# Altium footprint library LUCHADOR PCBLIB.PcbLib: 75 footprints (part 1 of 5)
Each footprint in its own frame and in the unit in brackets; x right, y up, seen from the top. Pads: shape width x height; smd on the part's side, far side on the other; paste and mask are expansions set on the pad; w line width, h text height; cw(c..) or ccw(c..) is an arc to the next point about the centre after c.
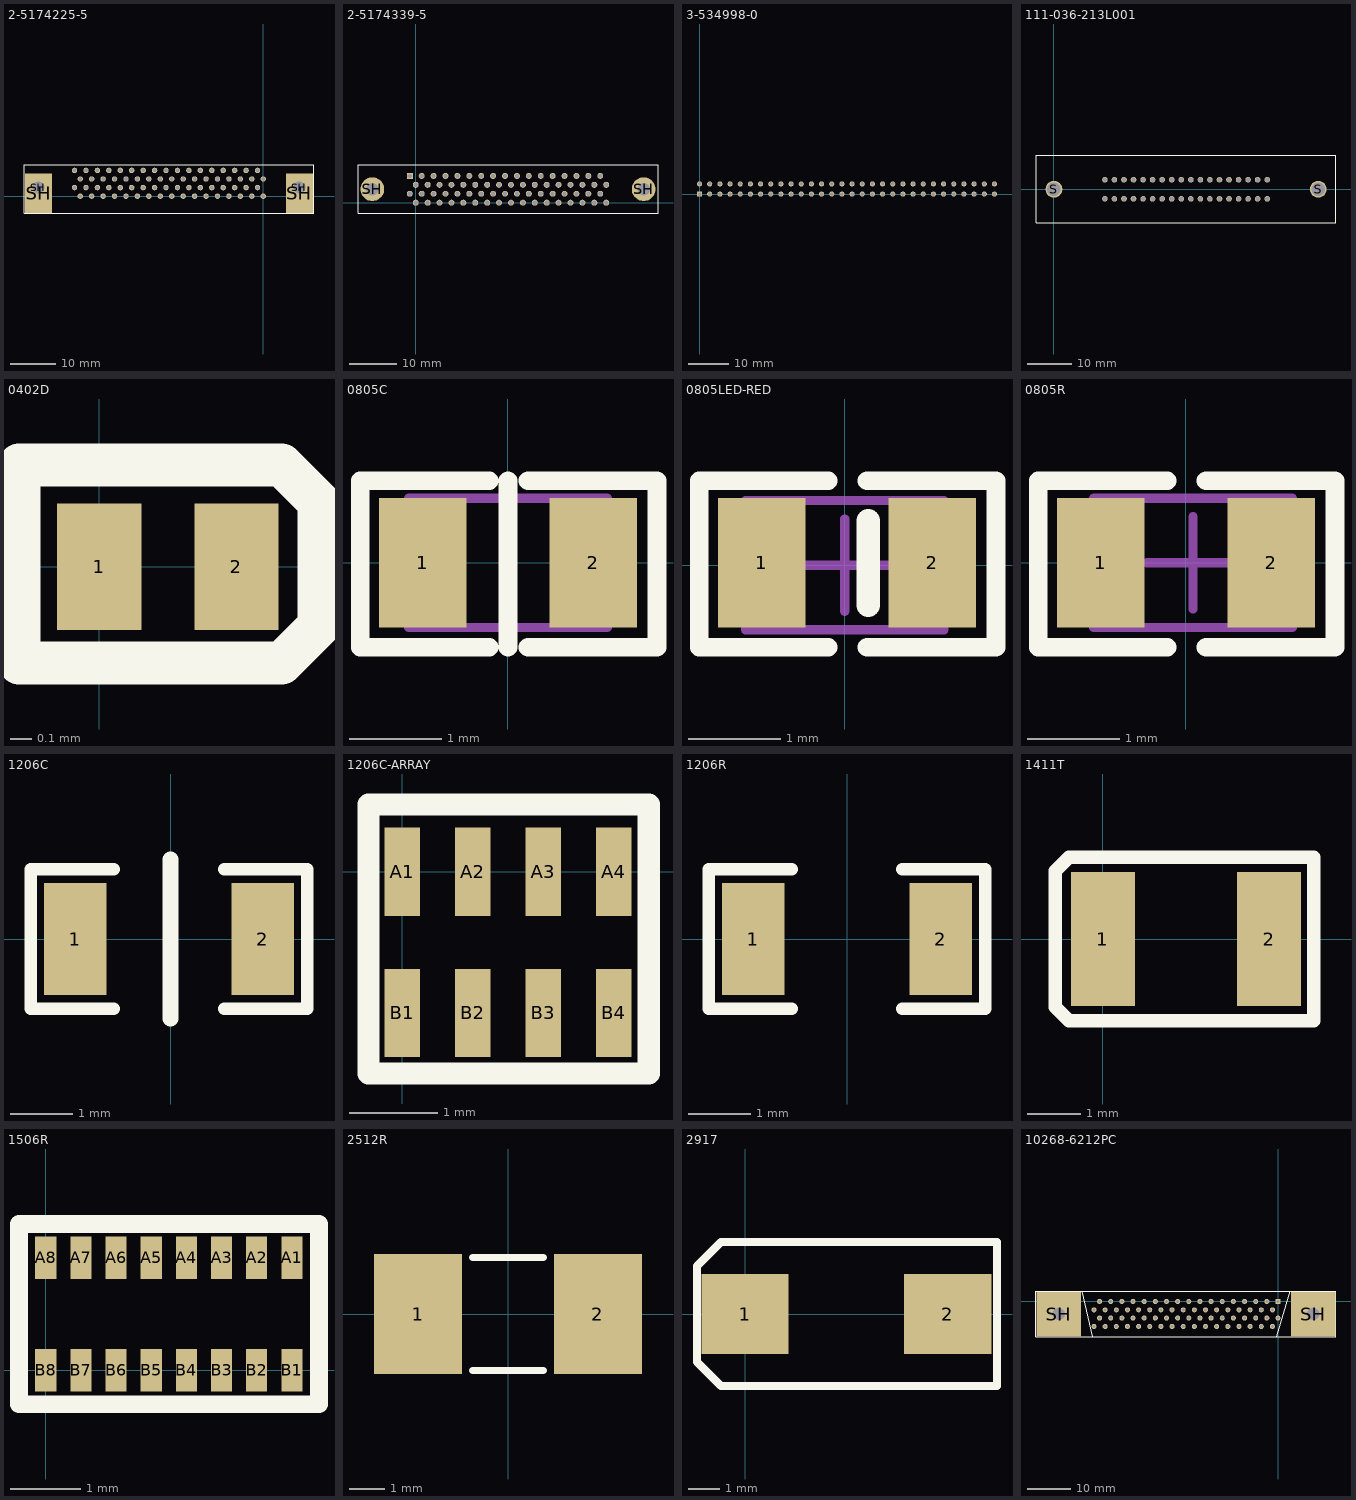
[diagram p0: the footprints below, top view; thin cyan lines are the x and y axes]

## 2-5174225-5 [mm]
pads (72):
  round 1.2 hole 0.8: 1(-41.91,5.715) 2(-40.64,3.81) 3(-39.37,5.715) 4(-38.1,3.81) 5(-36.83,5.715) 6(-35.56,3.81) 7(-34.29,5.715) 8(-33.02,3.81) 9(-31.75,5.715) 10(-30.48,3.81) 11(-29.21,5.715) 12(-27.94,3.81) 13(-26.67,5.715) 14(-25.4,3.81) 15(-24.13,5.715) 16(-22.86,3.81) 17(-21.59,5.715) 18(-20.32,3.81) 19(-19.05,5.715) 20(-17.78,3.81) 21(-16.51,5.715) 22(-15.24,3.81) 23(-13.97,5.715) 24(-12.7,3.81) 25(-11.43,5.715) 26(-10.16,3.81) 27(-8.89,5.715) 28(-7.62,3.81) 29(-6.35,5.715) 30(-5.08,3.81) 31(-3.81,5.715) 32(-2.54,3.81) 33(-1.27,5.715) 34(0,3.81) 35(-41.91,1.905) 36(-40.64,0) 37(-39.37,1.905) 38(-38.1,0) 39(-36.83,1.905) 40(-35.56,0) 41(-34.29,1.905) 42(-33.02,0) 43(-31.75,1.905) 44(-30.48,0) 45(-29.21,1.905) 46(-27.94,0) 47(-26.67,1.905) 48(-25.4,0) 49(-24.13,1.905) 50(-22.86,0) 51(-21.59,1.905) 52(-20.32,0) 53(-19.05,1.905) 54(-17.78,0) 55(-16.51,1.905) 56(-15.24,0) 57(-13.97,1.905) 58(-12.7,0) 59(-11.43,1.905) 60(-10.16,0) 61(-8.89,1.905) 62(-7.62,0) 63(-6.35,1.905) 64(-5.08,0) 65(-3.81,1.905) 66(-2.54,0) 67(-1.27,1.905) 68(0,0)
  round 3.7 hole 2.7: SH(-49.91,1.905) SH(8,1.905)
  rect 6x8.705 smd: SH(-49.886,0.66) SH(8.026,0.66)
Top Overlay:
  lines w0.254: -53.086,-3.81 11.176,-3.81 11.176,6.985 -53.086,6.985 -53.086,-3.81
3D body "c-2-5174225-5-a-3d.stp": height 9.51, standoff -2.89, extent -52.908,-10.515 11.002,6.985

## 2-5174339-5 [mil]
pads (70):
  rect 50x50 hole 35: 1(-50,225)
  round 50 hole 35: 2(0,150) 3(50,225) 4(100,150) 5(150,225) 6(200,150) 7(250,225) 8(300,150) 9(350,225) 10(400,150) 11(450,225) 12(500,150) 13(550,225) 14(600,150) 15(650,225) 16(700,150) 17(750,225) 18(800,150) 19(850,225) 20(900,150) 21(950,225) 22(1000,150) 23(1050,225) 24(1100,150) 25(1150,225) 26(1200,150) 27(1250,225) 28(1300,150) 29(1350,225) 30(1400,150) 31(1450,225) 32(1500,150) 33(1550,225) 34(1600,150) 35(-50,75) 36(0,0) 37(50,75) 38(100,0) 39(150,75) 40(200,0) 41(250,75) 42(300,0) 43(350,75) 44(400,0) 45(450,75) 46(500,0) 47(550,75) 48(600,0) 49(650,75) 50(700,0) 51(750,75) 52(800,0) 53(850,75) 54(900,0) 55(950,75) 56(1000,0) 57(1050,75) 58(1100,0) 59(1150,75) 60(1200,0) 61(1250,75) 62(1300,0) 63(1350,75) 64(1400,0) 65(1450,75) 66(1500,0) 67(1550,75) 68(1600,0)
  round 200 hole 106.3: SH(-365,113) SH(1915,113)
Top Overlay:
  lines w10: -485,-90 2035,-90 2035,320 -485,320 -485,-90
3D body "c-2-5174339-5-a-3d.stp": height 366.64, standoff -121.55, extent -483,-89.76 2033.14,315.76

## 3-534998-0 [mil]
pads (60):
  rect 50x50 hole 35: 1(0,0)
  round 50 hole 35: 2(0,100) 3(100,0) 4(100,100) 5(200,0) 6(200,100) 7(300,0) 8(300,100) 9(400,0) 10(400,100) 11(500,0) 12(500,100) 13(600,0) 14(600,100) 15(700,0) 16(700,100) 17(800,0) 18(800,100) 19(900,0) 20(900,100) 21(1000,0) 22(1000,100) 23(1100,0) 24(1100,100) 25(1200,0) 26(1200,100) 27(1300,0) 28(1300,100) 29(1400,0) 30(1400,100) 31(1500,0) 32(1500,100) 33(1600,0) 34(1600,100) 35(1700,0) 36(1700,100) 37(1800,0) 38(1800,100) 39(1900,0) 40(1900,100) 41(2000,0) 42(2000,100) 43(2100,0) 44(2100,100) 45(2200,0) 46(2200,100) 47(2300,0) 48(2300,100) 49(2400,0) 50(2400,100) 51(2500,0) 52(2500,100) 53(2600,0) 54(2600,100) 55(2700,0) 56(2700,100) 57(2800,0) 58(2800,100) 59(2900,0) 60(2900,100)

## 111-036-213L001 [mil]
pads (38):
  round 50 hole 39: 1(1898,85) 2(1813,85) 3(1728,85) 4(1643,85) 5(1558,85) 6(1473,85) 7(1388,85) 8(1303,85) 9(1218,85) 10(1133,85) 11(1048,85) 12(963,85) 13(878,85) 14(793,85) 15(708,85) 16(623,85) 17(538,85) 18(453,85) 19(1898,-85) 20(1813,-85) 21(1728,-85) 22(1643,-85) 23(1558,-85) 24(1473,-85) 25(1388,-85) 26(1303,-85) 27(1218,-85) 28(1133,-85) 29(1048,-85) 30(963,-85) 31(878,-85) 32(793,-85) 33(708,-85) 34(623,-85) 35(538,-85) 36(453,-84)
  round 150 hole 120: S(0,0) S(2352,0)
Top Overlay:
  lines w10: -160,-300 2510,-300 2510,305 -160,305 -160,-300
3D body "111-036-213L001.STEP": height 502.5, standoff -216.5, extent -157.5,-301 2509.5,301

## 0402D [mm]
pads (2):
  rect 0.4x0.6 smd: 1(0,0) 2(0.65,0)
Top Overlay:
  lines w0.203: -0.381,-0.457 0.864,-0.457 1.041,-0.279 1.041,0.305 0.864,0.483 -0.381,0.483 -0.381,-0.457
3D body "DPY.STEP": height 0.46, standoff 0.01, extent -0.17,-0.295 0.83,0.305

## 0805C [mm]
height 0.762
pads (2):
  rect 0.95x1.4 smd: 1(-0.925,0) 2(0.925,0)
Top Overlay:
  lines w0.203: -0.204,-0.914 -1.601,-0.914 -1.601,0.889 -0.204,0.889 ; 0,-0.914 0,0.889 ; 0.218,-0.914 1.615,-0.914 1.615,0.889 0.218,0.889
Mechanical 13:
  lines w0.1: -1.075,-0.7 1.075,-0.7 1.075,0.7 -1.075,0.7 -1.075,-0.7
3D body "SW3dPS-0805 SMD Capacitor.STEP": height 0.8, standoff 0.02, extent -1,-0.61 1,0.64

## 0805LED-RED [mm] "Chip Resistor, Body 2.0x1.3mm, IPC Low Density"
height 0.65
pads (2):
  rect 0.95x1.4 smd: 1(-0.9,0.025) 2(0.95,0.025)
Top Overlay:
  lines w0.203: -0.179,-0.889 -1.576,-0.889 -1.576,0.914 -0.179,0.914 ; 0.243,-0.889 1.64,-0.889 1.64,0.914 0.243,0.914
  lines w0.254: 0.254,-0.432 0.254,0.483
Mechanical 13:
  lines w0.1: -1.075,-0.7 1.075,-0.7 1.075,0.7 -1.075,0.7 -1.075,-0.7
Mechanical 15:
  lines w0.1: -0.5,0 0.5,0 ; 0,-0.5 0,0.5
3D body "User Library-led_0805.STEP": height 1.1, standoff 0, extent -1.035,-0.599 0.985,0.65

## 0805R [mm] "Chip Resistor, Body 2.0x1.3mm, IPC Low Density"
height 0.65
pads (2):
  rect 0.95x1.4 smd: 1(-0.925,0) 2(0.925,0)
Top Overlay:
  lines w0.203: -0.204,-0.914 -1.601,-0.914 -1.601,0.889 -0.204,0.889 ; 0.218,-0.914 1.615,-0.914 1.615,0.889 0.218,0.889
Mechanical 13:
  lines w0.1: -1,-0.7 1.15,-0.7 1.15,0.7 -1,0.7 -1,-0.7
Mechanical 15:
  lines w0.1: -0.425,0 0.575,0 ; 0.075,-0.5 0.075,0.5
3D body "SW3dPS-0805 SMD Resistor.STEP": height 0.8, standoff 0.02, extent -1.01,-0.625 0.99,0.625

## 1206C [mm]
pads (2):
  rect 1x1.8 smd: 1(-1.525,0) 2(1.475,0)
Top Overlay:
  lines w0.203: -0.914,-1.118 -2.235,-1.118 -2.235,1.118 -0.914,1.118 ; 0.864,-1.118 2.184,-1.118 2.184,1.118 0.864,1.118
  lines w0.254: 0,-1.27 0,1.27
3D body "MK316.STEP": height 1.62, standoff 0.02, extent -1.625,-0.838 1.575,0.762

## 1206C-ARRAY [mm]
pads (8):
  rect 0.4x1 smd: A1(0,0) A2(0.8,0) A3(1.6,0) A4(2.4,0) B1(0,-1.6) B2(0.8,-1.6) B3(1.6,-1.6) B4(2.4,-1.6)
Top Overlay:
  lines w0.254: -0.381,-2.286 2.794,-2.286 2.794,0.762 -0.381,0.762 -0.381,-2.286
3D body "User Library-ArrayCap1206.STEP": height 1.03, standoff 0.01, extent -0.33,-1.549 2.718,-0.025

## 1206R [mm]
pads (2):
  rect 1x1.8 smd: 1(-1.5,0) 2(1.5,0)
Top Overlay:
  lines w0.203: -0.889,-1.118 -2.21,-1.118 -2.21,1.118 -0.889,1.118 ; 0.889,-1.118 2.21,-1.118 2.21,1.118 0.889,1.118
3D body "SW3dPS-1206 SMD Resistor.STEP": height 1.02, standoff 0.02, extent -1.575,-0.787 1.625,0.813

## 1411T [mm]
pads (2):
  rect 1.2x2.5 smd: 1(0,0) 2(3.1,0)
Top Overlay:
  lines w0.254: -0.889,-1.27 -0.635,-1.524 3.937,-1.524 3.937,1.524 -0.635,1.524 -0.889,1.27 -0.889,-1.27
3D body "User Library-AVX_BCASE.STEP": height 2.03, standoff 0, extent -0.3,-1.465 3.4,1.465

## 1506R [mm]
pads (16):
  rect 0.3x0.6 smd: A1(3.5,1.6) A2(3,1.6) A3(2.5,1.6) A4(2,1.6) A5(1.5,1.6) A6(1,1.6) A7(0.5,1.6) A8(0,1.6) B1(3.5,0) B2(3,0) B3(2.5,0) B4(2,0) B5(1.5,0) B6(1,0) B7(0.5,0) B8(0,0)
Top Overlay:
  lines w0.254: -0.381,-0.483 3.886,-0.483 3.886,2.083 -0.381,2.083 -0.381,-0.483
3D body "RESISTOR ARRAY.STEP": height 0.46, standoff 0.01, extent -0.147,-0.013 3.653,1.587

## 2512R [mm] "Chip Resistor; Body 6.4 x 3.2 mm (LxW typ)"
height 1.2
pads (2):
  rect 2.5x3.4 smd: 1(-2.55,0) 2(2.55,0)
Top Overlay:
  lines w0.2: -1,-1.6 1,-1.6 ; -1,1.6 1,1.6
3D body "User Library-2512 SMD Resistor.STEP": height 1.62, standoff 0.02, extent -3.022,-1.424 3.328,1.576

## 2917 [mm]
pads (2):
  rect 2.77x2.55 smd: 1(0,0) 2(6.44,0)
Top Overlay:
  lines w0.254: -1.524,-1.524 -0.762,-2.286 8.001,-2.286 8.001,2.286 -0.508,2.286 -0.762,2.286 -1.524,1.524 -1.524,-1.524
3D body "User Library-AVX_E_CASE.STEP": height 4.21, standoff 0.01, extent -0.525,-2.225 6.876,2.225

## 10268-6212PC [mil]
pads (70):
  rect 45x45 hole 28: 1(0,0)
  round 45 hole 28: 2(-50,-75) 3(-100,0) 4(-150,-75) 5(-200,0) 6(-250,-75) 7(-300,0) 8(-350,-75) 9(-400,0) 10(-450,-75) 11(-500,0) 12(-550,-75) 13(-600,0) 14(-650,-75) 15(-700,0) 16(-750,-75) 17(-800,0) 18(-850,-75) 19(-900,0) 20(-950,-75) 21(-1000,0) 22(-1050,-75) 23(-1100,0) 24(-1150,-75) 25(-1200,0) 26(-1250,-75) 27(-1300,0) 28(-1350,-75) 29(-1400,0) 30(-1450,-75) 31(-1500,0) 32(-1550,-75) 33(-1600,0) 34(-1650,-75) 35(0,-149) 36(-50,-224) 37(-100,-149) 38(-150,-224) 39(-200,-149) 40(-250,-224) 41(-300,-149) 42(-350,-224) 43(-400,-149) 44(-450,-224) 45(-500,-149) 46(-550,-224) 47(-600,-149) 48(-650,-224) 49(-700,-149) 50(-750,-224) 51(-800,-149) 52(-850,-224) 53(-900,-149) 54(-950,-224) 55(-1000,-149) 56(-1050,-224) 57(-1100,-149) 58(-1150,-224) 59(-1200,-149) 60(-1250,-224) 61(-1300,-149) 62(-1350,-224) 63(-1400,-149) 64(-1450,-224) 65(-1500,-149) 66(-1550,-224) 67(-1600,-149) 68(-1650,-224)
  rect 400x400 hole 110: SH(-1966,-113) SH(315,-113)
Top Overlay:
  lines w10: -1760,90 -1665,-315 ; -10,-315 110,90 ; -2170,-315 520,-315 520,90 -2170,90 -2170,-315
3D body "10268-6212vc.stp": height 440.5, standoff -133.5, extent -2080,-292 430,68